# Altium footprint library MB1404.PcbLib: 69 footprints (part 2 of 5)
Each footprint in its own frame and in the unit in brackets; x right, y up, seen from the top. Pads: shape width x height; smd on the part's side, far side on the other; paste and mask are expansions set on the pad; w line width, h text height; cw(c..) or ccw(c..) is an arc to the next point about the centre after c.
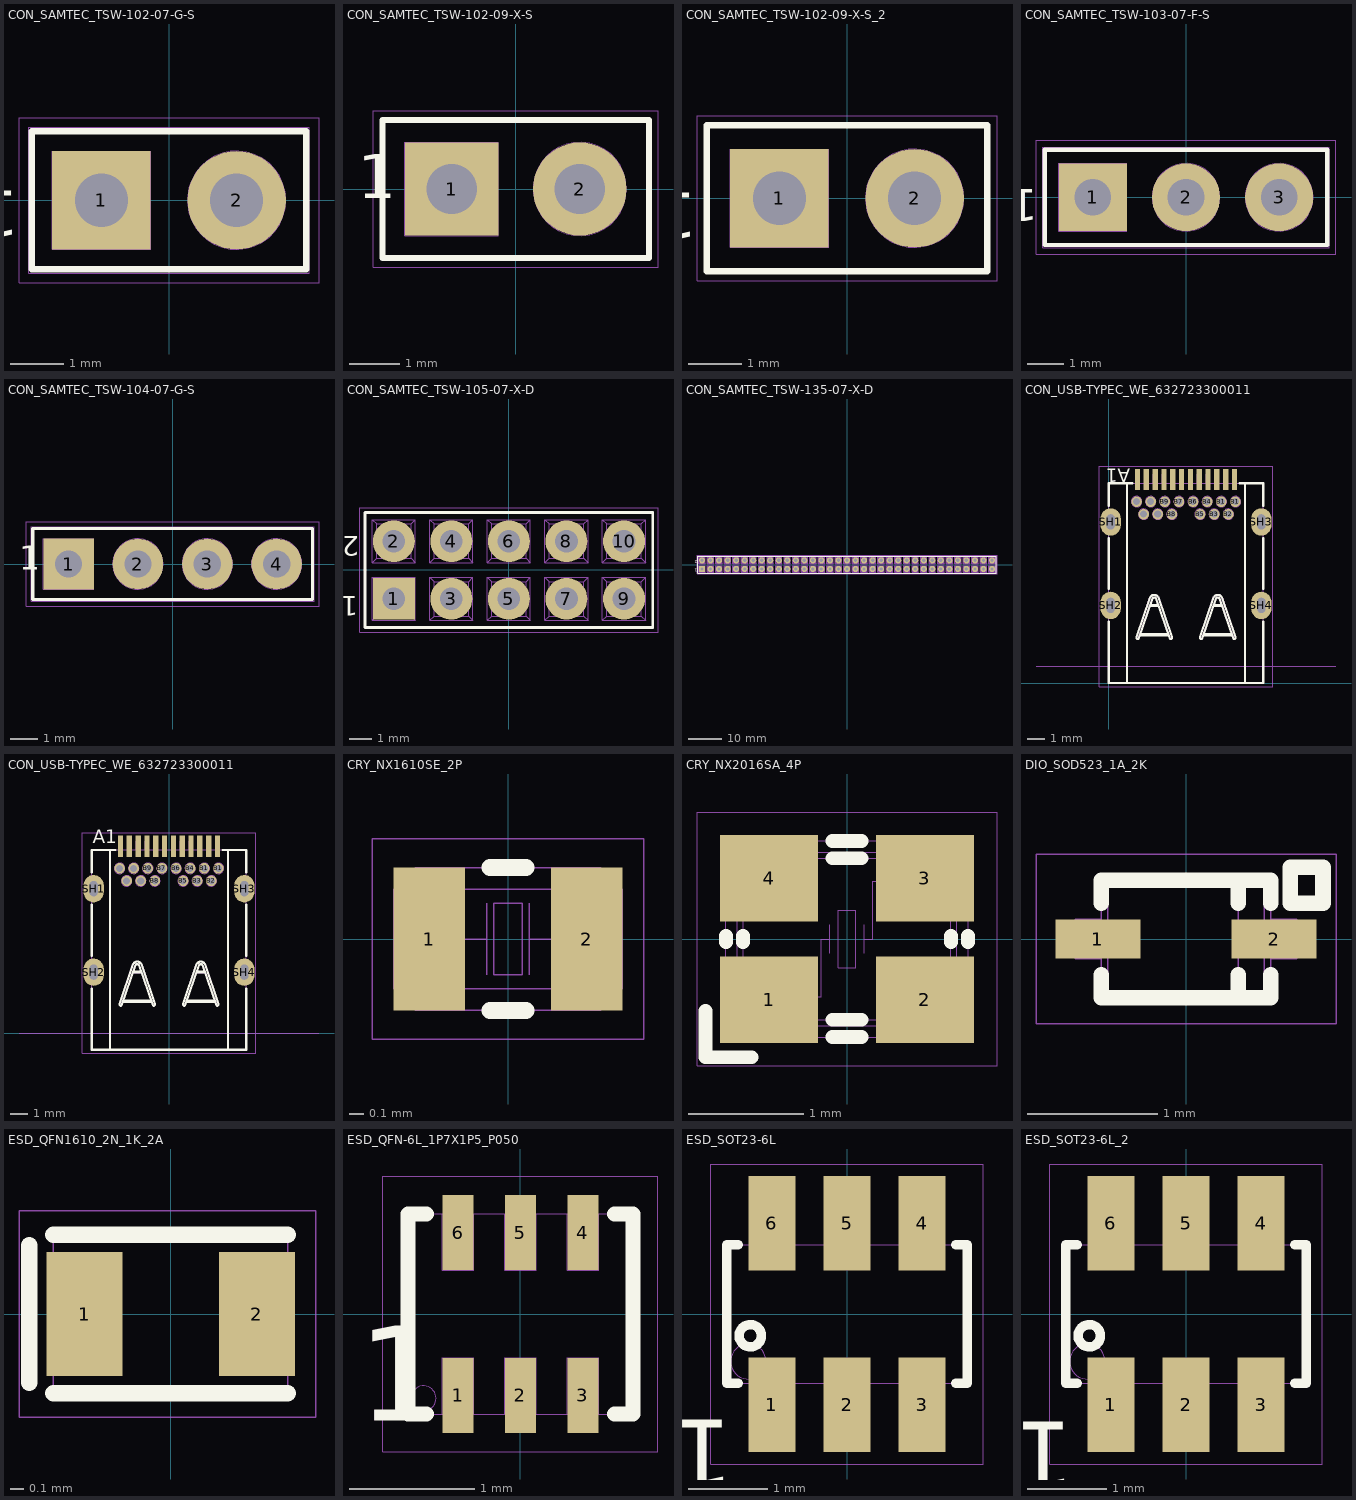
[diagram p1: the footprints below, top view; thin cyan lines are the x and y axes]

## CON_SAMTEC_TSW-102-07-G-S [mm]
height 8.38
pads (2):
  rect 1.85x1.85 / inner round 1.85 / far side rect 1.85x1.85 hole 1 mask+0.05: 1(-1.27,0)
  round 1.85 hole 1 mask+0.05: 2(1.27,0)
Top Overlay:
  lines w0.12: -2.58,-1.3 2.58,-1.3 2.58,1.3 -2.58,1.3 -2.58,-1.3
  text "1" at -2.819,0.474 h1.5
Mechanical 14:
  circle w0.01: c1.27,0 r0.925
  lines w0.01: -2.64,-1.37 2.64,-1.37 2.64,1.37 -2.64,1.37 -2.64,-1.37 ; -2.195,-0.925 -2.195,0.925 -0.345,0.925 -0.345,-0.925 -2.195,-0.925
  text "1" at -1.525,-0.525 h1.5
  text "'.Designator'" at 4.756,-0.251 h0.75
Mechanical 16:
  lines w0.01: -2.82,-1.55 2.82,-1.55 2.82,1.55 -2.82,1.55 -2.82,-1.55
3D body "TSW-102-07-G-S.stp": height 8.38, standoff -2.54, extent -2.667,-1.27 2.54,1.27
3D body: height 8.38, standoff 0, extent -2.579,-1.299 2.579,1.299

## CON_SAMTEC_TSW-102-09-X-S [mm]
height 8.38
pads (2):
  rect 1.85x1.85 / inner round 1.85 / far side rect 1.85x1.85 hole 1 mask+0.05: 1(-1.27,0)
  round 1.85 hole 1 mask+0.05: 2(1.27,0)
Top Overlay:
  lines w0.12: -2.64,-1.37 -2.64,1.37 2.64,1.37 2.64,-1.37 -2.64,-1.37
  text "1" at -3.125,-0.475 h1.5
Mechanical 14:
  circle w0.01: c1.27,0 r0.925
  lines w0.01: -2.64,-1.37 -2.64,1.37 2.64,1.37 2.64,-1.37 -2.64,-1.37 ; -2.195,-0.925 -0.345,-0.925 -0.345,0.925 -2.195,0.925 -2.195,-0.925
  text "'.Designator'" at -0.78,2.025 h0.75
  text "1" at -1.525,-0.525 h1.5
Mechanical 16:
  lines w0.01: -2.82,-1.55 -2.82,1.55 2.82,1.55 2.82,-1.55 -2.82,-1.55
3D body "TSW-102-09-G-S.stp": height 8.38, standoff -10.16, extent -2.667,-1.27 2.54,1.27
3D body: height 8.38, standoff 0, extent -2.579,-1.299 2.579,1.299

## CON_SAMTEC_TSW-102-09-X-S_2 [mm]
pads (2):
  rect 1.85x1.85 / inner round 1.85 / far side rect 1.85x1.85 hole 1 mask+0.05: 1(-1.27,0)
  round 1.85 hole 1 mask+0.05: 2(1.27,0)
Top Overlay:
  lines w0.12: -2.64,-1.37 2.64,-1.37 2.64,1.37 -2.64,1.37 -2.64,-1.37
  text "1" at -2.816,0.399 h1.5
Mechanical 14:
  circle w0.01: c1.27,0 r0.925
  lines w0.01: -2.64,-1.37 2.64,-1.37 2.64,1.37 -2.64,1.37 -2.64,-1.37 ; -2.195,-0.925 -2.195,0.925 -0.345,0.925 -0.345,-0.925 -2.195,-0.925
  text "1" at -1.525,-0.525 h1.5
  text "'.Designator'" at 4.509,-0.226 h0.75
Mechanical 16:
  lines w0.01: -2.82,-1.55 2.82,-1.55 2.82,1.55 -2.82,1.55 -2.82,-1.55
3D body: height 8.38, standoff 0, extent -2.579,-1.299 2.579,1.299
3D body "TSW-102-09-G-S.stp": height 8.38, standoff -10.16, extent -2.667,-1.27 2.54,1.27

## CON_SAMTEC_TSW-103-07-F-S [mm]
height 8.38
pads (3):
  rect 1.85x1.85 / inner round 1.85 / far side rect 1.85x1.85 hole 1 mask+0.05: 1(-2.54,0)
  round 1.85 hole 1 mask+0.05: 2(0,0) 3(2.54,0)
Top Overlay:
  lines w0.12: -3.85,-1.3 -3.85,1.3 3.85,1.3 3.85,-1.3 -3.85,-1.3
  text "1" at -4.044,0.504 h1.5
Mechanical 14:
  circle w0.01: c2.54,0 r0.925
  circle w0.01: c0,0 r0.925
  lines w0.01: -3.91,-1.37 -3.91,1.37 3.91,1.37 3.91,-1.37 -3.91,-1.37 ; -3.465,-0.925 -1.615,-0.925 -1.615,0.925 -3.465,0.925 -3.465,-0.925
  text "1" at -2.73,-0.5 h1.5
  text "'.Designator'" at 4.521,0.729 h0.75
Mechanical 16:
  lines w0.01: -4.09,-1.55 -4.09,1.55 4.09,1.55 4.09,-1.55 -4.09,-1.55
3D body: height 8.38, standoff 0, extent -3.915,-1.375 3.915,1.375
3D body "Samtec-TSW-103-07-F-S.STEP": height 8.38, standoff -2.54, extent -3.805,-1.27 3.815,1.27

## CON_SAMTEC_TSW-104-07-G-S [mm]
height 8.38
pads (4):
  rect 1.85x1.85 / inner round 1.85 / far side rect 1.85x1.85 hole 1 mask+0.05: 1(-3.81,0)
  round 1.85 hole 1 mask+0.05: 2(-1.27,0) 3(1.27,0) 4(3.81,0)
Top Overlay:
  lines w0.12: -5.12,-1.3 -5.12,1.3 5.12,1.3 5.12,-1.3 -5.12,-1.3
  text "1" at -5.625,-0.5 h1.5
Mechanical 14:
  circle w0.01: c3.81,0 r0.925
  circle w0.01: c1.27,0 r0.925
  circle w0.01: c-1.27,0 r0.925
  lines w0.01: -5.18,-1.37 -5.18,1.37 5.18,1.37 5.18,-1.37 -5.18,-1.37 ; -4.735,-0.925 -2.885,-0.925 -2.885,0.925 -4.735,0.925 -4.735,-0.925
  text "4" at 3.425,-0.45 h1.5
  text "1" at -4,-0.5 h1.5
  text "'.Designator'" at -4.626,-0.784 h0.75
Mechanical 16:
  lines w0.01: -5.36,-1.55 -5.36,1.55 5.36,1.55 5.36,-1.55 -5.36,-1.55
3D body: height 8.38, standoff 0, extent -5.185,-1.375 5.185,1.375
3D body "TSW-104-07-G-S.stp": height 8.38, standoff -2.54, extent -5.207,-1.27 5.08,1.27

## CON_SAMTEC_TSW-105-07-X-D [mm]
height 8.38
pads (10):
  rect 1.85x1.85 / inner round 1.85 / far side rect 1.85x1.85 hole 1 mask+0.05: 1(-5.08,-1.27)
  round 1.85 hole 1 mask+0.05: 2(-5.08,1.27) 3(-2.54,-1.27) 4(-2.54,1.27) 5(0,-1.27) 6(0,1.27) 7(2.54,-1.27) 8(2.54,1.27) 9(5.08,-1.27) 10(5.08,1.27)
Top Overlay:
  lines w0.12: -6.35,-2.54 6.35,-2.54 6.35,2.54 -6.35,2.54 -6.35,-2.54
  text "2" at -6.611,1.779 h1.5
  text "1" at -6.661,-0.871 h1.5
Mechanical 14:
  lines w0.01: -6.032,-2.222 -5.842,-2.032 ; -6.032,-2.222 -4.127,-2.222 ; -6.032,-2.222 -6.032,-0.318 ; -6.032,-0.318 -5.842,-0.508 ; -6.032,-0.318 -4.127,-0.318 ; -6.032,0.318 -6.032,2.222 ; -6.032,0.318 -4.127,0.318 ; -6.032,0.318 -5.842,0.508 ; -6.032,2.222 -4.127,2.222 ; -6.032,2.222 -5.842,2.032 ; -5.842,-2.032 -5.842,-0.508 ; -5.842,-2.032 -4.318,-2.032 ; -5.842,-0.508 -4.318,-0.508 ; -5.842,0.508 -4.318,0.508 ; -5.842,0.508 -5.842,2.032 ; -5.842,2.032 -4.318,2.032 ; -4.318,-2.032 -4.127,-2.222 ; -4.318,-2.032 -4.318,-0.508 ; -4.318,-0.508 -4.127,-0.318 ; -4.318,0.508 -4.318,2.032 ; -4.318,0.508 -4.127,0.318 ; -4.318,2.032 -4.127,2.222 ; -4.127,-2.222 -4.127,-0.318 ; -4.127,0.318 -4.127,2.222 ; -3.492,-2.222 -3.492,-0.318 ; -3.492,-2.222 -1.587,-2.222 ; -3.492,-2.222 -3.302,-2.032 ; -3.492,-0.318 -1.587,-0.318 ; -3.492,-0.318 -3.302,-0.508 ; -3.492,0.318 -3.492,2.222 ; -3.492,0.318 -1.587,0.318 ; -3.492,0.318 -3.302,0.508 ; -3.492,2.222 -1.587,2.222 ; -3.492,2.222 -3.302,2.032 ; -3.302,-2.032 -1.778,-2.032 ; -3.302,-2.032 -3.302,-0.508 ; -3.302,-0.508 -1.778,-0.508 ; -3.302,0.508 -1.778,0.508 ; -3.302,0.508 -3.302,2.032 ; -3.302,2.032 -1.778,2.032 ; -1.778,-2.032 -1.778,-0.508 ; -1.778,-2.032 -1.587,-2.222 ; -1.778,-0.508 -1.587,-0.318 ; -1.778,0.508 -1.778,2.032 ; -1.778,0.508 -1.587,0.318 ; -1.778,2.032 -1.587,2.222 ; -1.587,-2.222 -1.587,-0.318 ; -1.587,0.318 -1.587,2.222 ; -0.953,-2.222 -0.953,-0.318 ; -0.953,-2.222 0.953,-2.222 ; -0.953,-2.222 -0.762,-2.032 ; -0.953,-0.318 0.953,-0.318 ; -0.953,-0.318 -0.762,-0.508 ; -0.953,0.318 -0.953,2.222 ; -0.953,0.318 0.953,0.318 ; -0.953,0.318 -0.762,0.508 ; -0.953,2.222 0.953,2.222 ; -0.953,2.222 -0.762,2.032 ; -0.762,-2.032 0.762,-2.032 ; -0.762,-2.032 -0.762,-0.508 ; -0.762,-0.508 0.762,-0.508 ; -0.762,0.508 0.762,0.508 ; -0.762,0.508 -0.762,2.032 ; -0.762,2.032 0.762,2.032 ; 0.762,-2.032 0.762,-0.508 ; 0.762,-2.032 0.953,-2.222 ; 0.762,-0.508 0.953,-0.318 ; 0.762,0.508 0.762,2.032 ; 0.762,0.508 0.953,0.318 ; 0.762,2.032 0.953,2.222 ; 0.953,-2.222 0.953,-0.318 ; 0.953,0.318 0.953,2.222 ; 1.587,-2.222 1.587,-0.318 ; 1.587,-2.222 3.492,-2.222 ; 1.587,-2.222 1.778,-2.032 ; 1.587,-0.318 3.492,-0.318 ; 1.587,-0.318 1.778,-0.508 ; 1.587,0.318 1.587,2.222 ; 1.587,0.318 3.492,0.318 ; 1.587,0.318 1.778,0.508 ; 1.587,2.222 3.492,2.222 ; 1.587,2.222 1.778,2.032 ; 1.778,-2.032 3.302,-2.032 ; 1.778,-2.032 1.778,-0.508 ; 1.778,-0.508 3.302,-0.508 ; 1.778,0.508 3.302,0.508 ; 1.778,0.508 1.778,2.032 ; 1.778,2.032 3.302,2.032 ; 3.302,-2.032 3.302,-0.508 ; 3.302,-2.032 3.492,-2.222 ; 3.302,-0.508 3.492,-0.318 ; 3.302,0.508 3.302,2.032 ; 3.302,0.508 3.492,0.318 ; 3.302,2.032 3.492,2.222 ; 3.492,-2.222 3.492,-0.318 ; 3.492,0.318 3.492,2.222 ; 4.127,-2.222 4.127,-0.318 ; 4.127,-2.222 6.032,-2.222 ; 4.127,-2.222 4.318,-2.032 ; 4.127,-0.318 6.032,-0.318 ; 4.127,-0.318 4.318,-0.508 ; 4.127,0.318 4.127,2.222 ; 4.127,0.318 6.032,0.318 ; 4.127,0.318 4.318,0.508 ; 4.127,2.222 6.032,2.222 ; 4.127,2.222 4.318,2.032 ; 4.318,-2.032 5.842,-2.032 ; 4.318,-2.032 4.318,-0.508 ; 4.318,-0.508 5.842,-0.508 ; 4.318,0.508 5.842,0.508 ; 4.318,0.508 4.318,2.032 ; 4.318,2.032 5.842,2.032 ; 5.842,-2.032 5.842,-0.508 ; 5.842,-2.032 6.032,-2.222 ; 5.842,-0.508 6.032,-0.318 ; 5.842,0.508 5.842,2.032 ; 5.842,0.508 6.032,0.318 ; 5.842,2.032 6.032,2.222 ; 6.032,-2.222 6.032,-0.318 ; 6.032,0.318 6.032,2.222 ; -6.35,-2.54 6.35,-2.54 6.35,2.54 -6.35,2.54 -6.35,-2.54
  text "1" at -5.345,-1.725 h1.5
  text "2" at -5.445,0.775 h1.5
  text "10" at 4.43,0.8 h1.5
  text "9" at 4.82,-1.725 h1.5
  text "'.Designator'" at 2.114,0.529 h0.75
Mechanical 16:
  lines w0.01: -6.58,-2.75 -6.58,2.75 6.58,2.75 6.58,-2.75 -6.58,-2.75
3D body "TSW-105-07-G-D.stp": height 8.38, standoff -2.54, extent -6.35,-2.54 6.35,2.54
3D body: height 8.38, standoff 0, extent -6.35,-2.54 6.35,2.55

## CON_SAMTEC_TSW-135-07-X-D [mm]
height 8.38
pads (70):
  rect 1.85x1.85 / inner round 1.85 / far side rect 1.85x1.85 hole 1 mask+0.05: 1(-43.18,-1.27)
  round 1.85 hole 1 mask+0.05: 2(-43.18,1.27) 3(-40.64,-1.27) 4(-40.64,1.27) 5(-38.1,-1.27) 6(-38.1,1.27) 7(-35.56,-1.27) 8(-35.56,1.27) 9(-33.02,-1.27) 10(-33.02,1.27) 11(-30.48,-1.27) 12(-30.48,1.27) 13(-27.94,-1.27) 14(-27.94,1.27) 15(-25.4,-1.27) 16(-25.4,1.27) 17(-22.86,-1.27) 18(-22.86,1.27) 19(-20.32,-1.27) 20(-20.32,1.27) 21(-17.78,-1.27) 22(-17.78,1.27) 23(-15.24,-1.27) 24(-15.24,1.27) 25(-12.7,-1.27) 26(-12.7,1.27) 27(-10.16,-1.27) 28(-10.16,1.27) 29(-7.62,-1.27) 30(-7.62,1.27) 31(-5.08,-1.27) 32(-5.08,1.27) 33(-2.54,-1.27) 34(-2.54,1.27) 35(0,-1.27) 36(0,1.27) 37(2.54,-1.27) 38(2.54,1.27) 39(5.08,-1.27) 40(5.08,1.27) 41(7.62,-1.27) 42(7.62,1.27) 43(10.16,-1.27) 44(10.16,1.27) 45(12.7,-1.27) 46(12.7,1.27) 47(15.24,-1.27) 48(15.24,1.27) 49(17.78,-1.27) 50(17.78,1.27) 51(20.32,-1.27) 52(20.32,1.27) 53(22.86,-1.27) 54(22.86,1.27) 55(25.4,-1.27) 56(25.4,1.27) 57(27.94,-1.27) 58(27.94,1.27) 59(30.48,-1.27) 60(30.48,1.27) 61(33.02,-1.27) 62(33.02,1.27) 63(35.56,-1.27) 64(35.56,1.27) 65(38.1,-1.27) 66(38.1,1.27) 67(40.64,-1.27) 68(40.64,1.27) 69(43.18,-1.27) 70(43.18,1.27)
Top Overlay:
  lines w0.12: -44.45,-2.54 -44.45,2.54 44.45,2.54 44.45,-2.54 -44.45,-2.54
  text "2" at -44.631,1.649 h1.5
  text "1" at -44.606,-0.951 h1.5
Mechanical 14:
  drawing of 844 lines, arcs and shapes, not listed
  text "69" at 42.485,-1.725 h1.5
  text "70" at 42.51,0.825 h1.5
  text "2" at -43.495,0.85 h1.5
  text "1" at -43.395,-1.75 h1.5
  text "'.Designator'" at -0.681,0.874 h0.75
Mechanical 16:
  lines w0.01: -44.67,-2.75 44.67,-2.75 44.67,2.75 -44.67,2.75 -44.67,-2.75
3D body: height 8.38, standoff 0, extent -44.455,-2.545 44.45,2.545
3D body "TSW-135-07-G-D.stp": height 8.38, standoff -2.54, extent -44.45,-2.54 44.45,2.54

## CON_USB-TYPEC_WE_632723300011 [mm]
pads (30):
  rect 0.3x1.2 smd mask+0.05: A1(1.625,11.53) A2(2.125,11.53) A3(2.625,11.53) A4(3.125,11.53) A5(3.625,11.53) A6(4.125,11.53) A7(4.625,11.53) A8(5.125,11.53) A9(5.625,11.53) A10(6.125,11.53) A11(6.625,11.53) A12(7.125,11.53)
  round 0.6 hole 0.4 mask+0.05: B1(6.375,10.28) B1(7.175,10.28) B2(6.775,9.57) B3(5.975,9.57) B4(5.575,10.28) B5(5.175,9.57) B6(4.775,10.28) B7(3.975,10.28) B8(3.575,9.57) B9(3.175,10.28) B10(2.775,9.57) B11(1.975,9.57) B12(1.575,10.28) B12(2.375,10.28)
  oval 1.15x1.55 hole 0.45 slot 0.85 at 90 deg mask+0.05: SH1(0.105,9.13) SH2(0.105,4.4) SH3(8.645,9.13) SH4(8.645,4.4)
Top Overlay:
  lines w0.12: 0,3.475 0,0 8.75,0 8.75,3.475 ; 0,5.325 0,8.225 ; 0,10.05 0,11.325 1.35,11.325 ; 1.025,0 1.025,11.325 ; 1.75,2.7 3.4,2.7 ; 1.775,2.775 3.375,2.775 ; 2.325,4.375 2.825,4.375 ; 2.35,4.425 2.8,4.425 ; 5.35,2.7 7,2.7 ; 5.375,2.775 6.975,2.775 ; 5.925,4.375 6.425,4.375 ; 5.95,4.425 6.4,4.425 ; 7.4,11.325 8.75,11.325 8.75,10.05 ; 7.725,0 7.725,11.325 ; 8.75,5.325 8.75,8.225 ; 2.66,4.815 ccw(c2.575,4.729) 2.575,4.85 ccw(c2.575,4.729) 2.49,4.815 2.475,4.8 1.675,2.5 cw(c1.65,2.575) 1.575,2.6 2.325,4.85 2.404,4.929 cw(c2.575,4.759) 2.575,5 cw(c2.575,4.759) 2.746,4.929 2.825,4.85 3.575,2.6 cw(c3.5,2.575) 3.475,2.5 2.675,4.8 ; 2.66,4.815 2.675,4.8 ; 2.66,4.815 2.675,4.8 ; 6.075,4.8 6.09,4.815 ; 6.075,4.8 5.275,2.5 cw(c5.25,2.575) 5.175,2.6 5.925,4.85 6.004,4.929 cw(c6.175,4.759) 6.175,5 cw(c6.175,4.759) 6.346,4.929 6.425,4.85 7.175,2.6 cw(c7.1,2.575) 7.075,2.5 6.275,4.8 6.26,4.815 ccw(c6.175,4.729) 6.175,4.85 ccw(c6.175,4.729) 6.09,4.815 ; 6.075,4.8 6.09,4.815
  text "A1" at 1.225,12.395 h1.3
Mechanical 7:
  lines w0.01: -4.125,0.95 12.875,0.95
  text "EDGE" at 10.45,0.25 h1
  text "PCB" at -4.125,0.25 h1
Mechanical 14:
  circle w0.01: c7.175,10.28 r0.3
  circle w0.01: c6.775,9.57 r0.3
  circle w0.01: c6.375,10.28 r0.3
  circle w0.01: c5.975,9.57 r0.3
  circle w0.01: c5.575,10.28 r0.3
  circle w0.01: c5.175,9.57 r0.3
  circle w0.01: c4.775,10.28 r0.3
  circle w0.01: c3.975,10.28 r0.3
  circle w0.01: c3.575,9.57 r0.3
  circle w0.01: c3.175,10.28 r0.3
  circle w0.01: c2.775,9.57 r0.3
  circle w0.01: c2.375,10.28 r0.3
  circle w0.01: c1.975,9.57 r0.3
  circle w0.01: c1.575,10.28 r0.3
  lines w0.01: 1.025,0 1.025,11.33 ; 1.525,11.33 1.525,11.83 1.725,11.83 1.725,11.33 ; 1.75,2.7 3.4,2.7 ; 1.775,2.775 3.375,2.775 ; 2.025,11.33 2.025,11.83 2.225,11.83 2.225,11.33 ; 2.325,4.375 2.825,4.375 ; 2.35,4.425 2.8,4.425 ; 2.525,11.33 2.525,11.83 2.725,11.83 2.725,11.33 ; 3.025,11.33 3.025,11.83 3.225,11.83 3.225,11.33 ; 3.525,11.33 3.525,11.83 3.725,11.83 3.725,11.33 ; 4.025,11.33 4.025,11.83 4.225,11.83 4.225,11.33 ; 4.525,11.33 4.525,11.83 4.725,11.83 4.725,11.33 ; 5.025,11.33 5.025,11.83 5.225,11.83 5.225,11.33 ; 5.35,2.7 7,2.7 ; 5.375,2.775 6.975,2.775 ; 5.525,11.33 5.525,11.83 5.725,11.83 5.725,11.33 ; 5.925,4.375 6.425,4.375 ; 5.95,4.425 6.4,4.425 ; 6.025,11.33 6.025,11.83 6.225,11.83 6.225,11.33 ; 6.525,11.33 6.525,11.83 6.725,11.83 6.725,11.33 ; 7.025,11.33 7.025,11.83 7.225,11.83 7.225,11.33 ; 7.725,0 7.725,11.33 ; 2.66,4.815 ccw(c2.575,4.729) 2.575,4.85 ccw(c2.575,4.729) 2.49,4.815 2.475,4.8 1.675,2.5 cw(c1.65,2.575) 1.575,2.6 2.325,4.85 2.404,4.929 cw(c2.575,4.759) 2.575,5 cw(c2.575,4.759) 2.746,4.929 2.825,4.85 3.575,2.6 cw(c3.5,2.575) 3.475,2.5 2.675,4.8 ; 2.66,4.815 2.675,4.8 ; 2.66,4.815 2.675,4.8 ; 6.075,4.8 6.09,4.815 ; 6.075,4.8 5.275,2.5 cw(c5.25,2.575) 5.175,2.6 5.925,4.85 6.004,4.929 cw(c6.175,4.759) 6.175,5 cw(c6.175,4.759) 6.346,4.929 6.425,4.85 7.175,2.6 cw(c7.1,2.575) 7.075,2.5 6.275,4.8 6.26,4.815 ccw(c6.175,4.729) 6.175,4.85 ccw(c6.175,4.729) 6.09,4.815 ; 6.075,4.8 6.09,4.815 ; 0.005,0 0.005,11.33 8.745,11.33 8.745,0 0.005,0
  text "A12" at 6.75,11.4 h0.5
  text "A1" at 1.375,11.4 h0.5
  text "'.Designator'" at 6.25,7.645 h0.75
  text "B11" at 1.725,9.45 h0.4
  text "B9" at 2.875,10.15 h0.4
  text "B6" at 4.475,10.15 h0.4
  text "GND" at 6,10.15 h0.4
  text "B4" at 5.3,10.15 h0.4
  text "B10" at 2.475,9.425 h0.4
  text "B3" at 5.675,9.425 h0.4
  text "B8" at 3.3,9.45 h0.4
  text "B2" at 6.5,9.45 h0.4
  text "B7" at 3.7,10.15 h0.4
  text "B12" at 1.275,10.175 h0.4
  text "GND" at 2,10.15 h0.4
  text "B1" at 6.9,10.175 h0.4
  text "B5" at 4.9,9.425 h0.4
Mechanical 16:
  lines w0.01: -0.55,-0.2 9.3,-0.2 9.3,12.3 -0.55,12.3 -0.55,4.65 -0.55,-0.2
3D body "WURTH_ELEKTRONIK_USB_TYPE-C_632723300011_STP.stp": height 3.03, standoff -1.83, extent 0.005,-0.025 8.745,11.769
3D body: height 2.96, standoff 0, extent 0,0 8.75,11.325

## CON_USB-TYPEC_WE_632723300011  [mm] "MCD-02273"
height 2.96
pads (30):
  rect 0.3x1.2 smd mask+0.05: A1(-2.75,10.58) A2(-2.25,10.58) A3(-1.75,10.58) A4(-1.25,10.58) A5(-0.75,10.58) A6(-0.25,10.58) A7(0.25,10.58) A8(0.75,10.58) A9(1.25,10.58) A10(1.75,10.58) A11(2.25,10.58) A12(2.75,10.58)
  round 0.6 hole 0.4 mask+0.05: B1(2,9.33) B1(2.8,9.33) B2(2.4,8.62) B3(1.6,8.62) B4(1.2,9.33) B5(0.8,8.62) B6(0.4,9.33) B7(-0.4,9.33) B8(-0.8,8.62) B9(-1.2,9.33) B10(-1.6,8.62) B11(-2.4,8.62) B12(-2.8,9.33) B12(-2,9.33)
  oval 1.15x1.55 hole 0.45 slot 0.85 at 90 deg mask+0.05: SH1(-4.27,8.18) SH2(-4.27,3.45) SH3(4.27,8.18) SH4(4.27,3.45)
Top Overlay:
  lines w0.12: -4.375,2.525 -4.375,-0.95 4.375,-0.95 4.375,2.525 ; -4.375,4.375 -4.375,7.275 ; -4.375,9.1 -4.375,10.375 -3.025,10.375 ; -3.35,-0.95 -3.35,10.375 ; -2.625,1.75 -0.975,1.75 ; -2.6,1.825 -1,1.825 ; -2.05,3.425 -1.55,3.425 ; -2.025,3.475 -1.575,3.475 ; 0.975,1.75 2.625,1.75 ; 1,1.825 2.6,1.825 ; 1.55,3.425 2.05,3.425 ; 1.575,3.475 2.025,3.475 ; 3.025,10.375 4.375,10.375 4.375,9.1 ; 3.35,-0.95 3.35,10.375 ; 4.375,4.375 4.375,7.275 ; -1.715,3.865 ccw(c-1.8,3.779) -1.8,3.9 ccw(c-1.8,3.779) -1.885,3.865 -1.9,3.85 -2.7,1.55 cw(c-2.725,1.625) -2.8,1.65 -2.05,3.9 -1.971,3.979 cw(c-1.8,3.809) -1.8,4.05 cw(c-1.8,3.809) -1.629,3.979 -1.55,3.9 -0.8,1.65 cw(c-0.875,1.625) -0.9,1.55 -1.7,3.85 ; -1.715,3.865 -1.7,3.85 ; -1.715,3.865 -1.7,3.85 ; 1.7,3.85 1.715,3.865 ; 1.7,3.85 0.9,1.55 cw(c0.875,1.625) 0.8,1.65 1.55,3.9 1.629,3.979 cw(c1.8,3.809) 1.8,4.05 cw(c1.8,3.809) 1.971,3.979 2.05,3.9 2.8,1.65 cw(c2.725,1.625) 2.7,1.55 1.9,3.85 1.885,3.865 ccw(c1.8,3.779) 1.8,3.9 ccw(c1.8,3.779) 1.715,3.865 ; 1.7,3.85 1.715,3.865
  text "A1" at -4.325,10.505 h1.3
Mechanical 7:
  lines w0.01: -8.5,0 8.5,0
  text "EDGE" at 6.075,-0.7 h1
  text "PCB" at -8.5,-0.7 h1
Mechanical 14:
  circle w0.01: c2.8,9.33 r0.3
  circle w0.01: c2.4,8.62 r0.3
  circle w0.01: c2,9.33 r0.3
  circle w0.01: c1.6,8.62 r0.3
  circle w0.01: c1.2,9.33 r0.3
  circle w0.01: c0.8,8.62 r0.3
  circle w0.01: c0.4,9.33 r0.3
  circle w0.01: c-0.4,9.33 r0.3
  circle w0.01: c-0.8,8.62 r0.3
  circle w0.01: c-1.2,9.33 r0.3
  circle w0.01: c-1.6,8.62 r0.3
  circle w0.01: c-2,9.33 r0.3
  circle w0.01: c-2.4,8.62 r0.3
  circle w0.01: c-2.8,9.33 r0.3
  lines w0.01: -3.35,-0.95 -3.35,10.38 ; -2.85,10.38 -2.85,10.88 -2.65,10.88 -2.65,10.38 ; -2.625,1.75 -0.975,1.75 ; -2.6,1.825 -1,1.825 ; -2.35,10.38 -2.35,10.88 -2.15,10.88 -2.15,10.38 ; -2.05,3.425 -1.55,3.425 ; -2.025,3.475 -1.575,3.475 ; -1.85,10.38 -1.85,10.88 -1.65,10.88 -1.65,10.38 ; -1.35,10.38 -1.35,10.88 -1.15,10.88 -1.15,10.38 ; -0.85,10.38 -0.85,10.88 -0.65,10.88 -0.65,10.38 ; -0.35,10.38 -0.35,10.88 -0.15,10.88 -0.15,10.38 ; 0.15,10.38 0.15,10.88 0.35,10.88 0.35,10.38 ; 0.65,10.38 0.65,10.88 0.85,10.88 0.85,10.38 ; 0.975,1.75 2.625,1.75 ; 1,1.825 2.6,1.825 ; 1.15,10.38 1.15,10.88 1.35,10.88 1.35,10.38 ; 1.55,3.425 2.05,3.425 ; 1.575,3.475 2.025,3.475 ; 1.65,10.38 1.65,10.88 1.85,10.88 1.85,10.38 ; 2.15,10.38 2.15,10.88 2.35,10.88 2.35,10.38 ; 2.65,10.38 2.65,10.88 2.85,10.88 2.85,10.38 ; 3.35,-0.95 3.35,10.38 ; -1.715,3.865 ccw(c-1.8,3.779) -1.8,3.9 ccw(c-1.8,3.779) -1.885,3.865 -1.9,3.85 -2.7,1.55 cw(c-2.725,1.625) -2.8,1.65 -2.05,3.9 -1.971,3.979 cw(c-1.8,3.809) -1.8,4.05 cw(c-1.8,3.809) -1.629,3.979 -1.55,3.9 -0.8,1.65 cw(c-0.875,1.625) -0.9,1.55 -1.7,3.85 ; -1.715,3.865 -1.7,3.85 ; -1.715,3.865 -1.7,3.85 ; 1.7,3.85 1.715,3.865 ; 1.7,3.85 0.9,1.55 cw(c0.875,1.625) 0.8,1.65 1.55,3.9 1.629,3.979 cw(c1.8,3.809) 1.8,4.05 cw(c1.8,3.809) 1.971,3.979 2.05,3.9 2.8,1.65 cw(c2.725,1.625) 2.7,1.55 1.9,3.85 1.885,3.865 ccw(c1.8,3.779) 1.8,3.9 ccw(c1.8,3.779) 1.715,3.865 ; 1.7,3.85 1.715,3.865 ; -4.37,-0.95 -4.37,10.38 4.37,10.38 4.37,-0.95 -4.37,-0.95
  text "A12" at 2.375,10.45 h0.5
  text "A1" at -3,10.45 h0.5
  text "B4" at 0,0 h0.4
  text "GND" at 0,0 h0.4
  text "GND" at 0,0 h0.4
  text "B6" at 0,0 h0.4
  text "B9" at 0,0 h0.4
  text "B1" at 0,0 h0.4
  text "B3" at 0,0 h0.4
  text "B10" at 0,0 h0.4
  text "B2" at 0,0 h0.4
  text "B7" at 0,0 h0.4
  text "'.Designator'" at 0,0 h0.75
  text "B12" at 0,0 h0.4
  text "B11" at 0,0 h0.4
  text "B5" at 0,0 h0.4
  text "B8" at 0,0 h0.4
Mechanical 16:
  lines w0.01: -4.925,-1.15 4.925,-1.15 4.925,11.35 -4.925,11.35 -4.925,3.7 -4.925,-1.15
3D body "WURTH_ELEKTRONIK_USB_TYPE-C_632723300011_STP.stp": height 3.03, standoff -1.83, extent -4.37,-0.975 4.37,10.819
3D body: height 2.96, standoff 0, extent -4.375,-0.95 4.375,10.375

## CRY_NX1610SE_2P [mm] "MCD-02291"
height 0.45
pads (2):
  rect 0.5x1 smd mask+0.05: 1(-0.55,0) 2(0.55,0)
Top Overlay:
  lines w0.12: -0.125,-0.5 0.125,-0.5 ; -0.125,0.5 0.125,0.5
Mechanical 14:
  lines w0.01: -0.5,0 -0.15,0 ; -0.15,-0.25 -0.15,0.25 ; 0.15,-0.25 0.15,0.25 ; 0.15,0 0.5,0 ; -0.8,-0.35 cw(c-0.8,-0.5) -0.65,-0.5 0.65,-0.5 cw(c0.8,-0.5) 0.8,-0.35 0.8,0.35 cw(c0.8,0.5) 0.65,0.5 -0.65,0.5 cw(c-0.8,0.5) -0.8,0.35 -0.8,-0.35 ; -0.65,-0.2 ccw(c-0.5,-0.2) -0.5,-0.35 0.5,-0.35 ccw(c0.5,-0.2) 0.65,-0.2 0.65,0.2 ccw(c0.5,0.2) 0.5,0.35 -0.5,0.35 ccw(c-0.5,0.2) -0.65,0.2 -0.65,-0.2 ; -0.1,-0.25 -0.1,0.25 0.1,0.25 0.1,-0.25 -0.1,-0.25
  text "'.Designator'" at 0.625,0.5 h0.75
Mechanical 16:
  lines w0.01: -0.95,-0.7 -0.95,0.7 0.95,0.7 0.95,-0.7 -0.95,-0.7
3D body: height 0.25, standoff 0, extent -0.8,-0.5 0.8,0.5
3D body: height 0.35, standoff 0.25, extent -0.65,-0.35 0.65,0.35
3D body: height 0.45, standoff 0.35, extent -0.6,-0.3 0.6,0.3

## CRY_NX2016SA_4P [mm]
height 0.5
pads (4):
  rect 0.85x0.75 smd mask+0.05: 1(-0.675,-0.525) 2(0.675,-0.525) 3(0.675,0.525) 4(-0.675,0.525)
Top Overlay:
  lines w0.12: -1.225,-0.625 -1.225,-1.025 -0.825,-1.025 ; -1.05,-0.025 -1.05,0.025 ; -0.9,-0.025 -0.9,0.025 ; -0.125,-0.85 0.125,-0.85 ; -0.125,-0.7 0.125,-0.7 ; -0.125,0.7 0.125,0.7 ; -0.125,0.85 0.125,0.85 ; 0.9,-0.025 0.9,0.025 ; 1.05,-0.025 1.05,0.025
Mechanical 14:
  lines w0.01: -0.9,-0.25 -0.35,-0.25 -0.35,-0.7 ; -0.9,0.25 -0.35,0.25 -0.35,0.7 ; -0.325,-0.5 -0.225,-0.5 -0.225,0 -0.15,0 ; -0.15,-0.125 -0.15,0.125 ; 0.15,-0.125 0.15,0.125 ; 0.15,0 0.225,0 0.225,0.5 0.325,0.5 ; 0.35,-0.7 0.35,-0.25 0.9,-0.25 ; 0.35,0.7 0.35,0.25 0.9,0.25 ; -1.05,-0.7 cw(c-1.05,-0.85) -0.9,-0.85 0.9,-0.85 cw(c1.05,-0.85) 1.05,-0.7 1.05,0.7 cw(c1.05,0.85) 0.9,0.85 -0.9,0.85 cw(c-1.05,0.85) -1.05,0.7 -1.05,-0.7 ; -0.95,-0.6 ccw(c-0.8,-0.6) -0.8,-0.75 0.8,-0.75 ccw(c0.8,-0.6) 0.95,-0.6 0.95,0.6 ccw(c0.8,0.6) 0.8,0.75 -0.8,0.75 ccw(c-0.8,0.6) -0.95,0.6 -0.95,-0.6 ; -0.9,-0.6 ccw(c-0.8,-0.6) -0.8,-0.7 0.8,-0.7 ccw(c0.8,-0.6) 0.9,-0.6 0.9,0.6 ccw(c0.8,0.6) 0.8,0.7 -0.8,0.7 ccw(c-0.8,0.6) -0.9,0.6 -0.9,-0.6 ; -0.075,-0.25 -0.075,0.25 0.075,0.25 0.075,-0.25 -0.075,-0.25
  text "1" at -0.725,-0.65 h0.5
  text "2" at 0.525,-0.65 h0.5
  text "3" at 0.525,0.325 h0.5
  text "4" at -0.75,0.325 h0.5
  text "'.Designator'" at -2.229,4.466 h0.75
Mechanical 16:
  lines w0.01: -1.3,-1.1 1.3,-1.1 1.3,1.1 -1.3,1.1 -1.3,-1.1
3D body "NX2016.STEP": height 0.7, standoff 0, extent -1,-0.8 1,0.8
3D body: height 0.51, standoff 0.5, extent -0.9,-0.7 -0.575,-0.375
3D body: height 0.5, standoff 0, extent -1.05,-0.85 1.05,0.85

## DIO_SOD523_1A_2K [mm] "MCD-01677"
height 0.7
pads (2):
  rect 0.65x0.3 smd mask+0.05: 1(-0.675,0) 2(0.675,0)
Top Overlay:
  lines w0.12: -0.65,-0.275 -0.65,-0.45 0.65,-0.45 0.65,-0.275 ; -0.65,0.275 -0.65,0.45 0.65,0.45 0.65,0.275 ; 0.4,-0.45 0.4,-0.275 ; 0.4,0.275 0.4,0.45 ; 0.8,0.275 1.05,0.275 1.05,0.55 0.8,0.55 0.8,0.275
Mechanical 14:
  lines w0.01: -0.65,-0.15 -0.85,-0.15 -0.85,0.15 -0.65,0.15 ; 0.4,-0.4 0.4,0.4 ; 0.65,-0.15 0.85,-0.15 0.85,0.15 0.65,0.15 ; -0.65,-0.45 0.65,-0.45 ; -0.65,-0.45 -0.65,0.45 ; -0.65,-0.45 -0.6,-0.4 ; -0.65,0.45 0.65,0.45 ; -0.65,0.45 -0.6,0.4 ; -0.6,-0.4 -0.6,0.4 ; -0.6,-0.4 0.6,-0.4 ; -0.6,-0.4 -0.6,-0.4 ; -0.6,0.4 0.6,0.4 ; -0.6,0.4 -0.6,0.4 ; 0.6,-0.4 0.6,0.4 ; 0.6,-0.4 0.6,-0.4 ; 0.6,-0.4 0.65,-0.45 ; 0.6,0.4 0.65,0.45 ; 0.65,-0.45 0.65,0.45 ; 0.65,0.45 0.65,0.45
  text "K" at 0.675,0.175 h0.45
  text "'.Designator'" at 4.425,0.825 h0.75
Mechanical 16:
  lines w0.01: -1.15,-0.65 -1.15,0.65 1.15,0.65 1.15,-0.65 -1.15,-0.65
3D body: height 0.71, standoff 0.7, extent 0.4,-0.4 0.6,0.4
3D body: height 0.7, standoff 0.15, extent -0.65,-0.45 0.65,0.45
3D body: height 0.15, standoff 0, extent -0.65,-0.45 0.65,0.45
3D body: height 0.15, standoff 0, extent -0.85,-0.15 -0.4,0.15
3D body: height 0.15, standoff 0, extent 0.4,-0.15 0.85,0.15

## ESD_QFN1610_2N_1K_2A [mm] "DFN, 2-Leads, Body 1.60x1.00mm"
height 0.6
pads (2):
  rect 0.55x0.9 smd mask+0.05: 1(-0.625,0) 2(0.625,0)
Top Overlay:
  lines w0.12: -1.025,-0.5 -1.025,0.5 ; -0.85,-0.575 0.85,-0.575 ; -0.85,0.575 0.85,0.575
Mechanical 14:
  lines w0.01: -0.85,-0.55 -0.85,0.55 0.85,0.55 0.85,-0.55 -0.85,-0.55
  text "K" at -0.8,-0.325 h1
  text "'.Designator'" at 2.2,0.55 h0.75
Mechanical 16:
  lines w0.01: -1.1,-0.75 -1.1,0.75 1.05,0.75 1.05,-0.75 -1.1,-0.75
3D body: height 0.6, standoff 0, extent -0.85,-0.55 0.85,0.55
3D body: height 0.6, standoff 0, extent -0.85,-0.55 0.85,0.55

## ESD_QFN-6L_1P7X1P5_P050 [mm]
height 0.55
pads (6):
  rect 0.25x0.6 smd mask+0.05: 1(-0.5,-0.65) 2(0,-0.65) 3(0.5,-0.65) 4(0.5,0.65) 5(0,0.65) 6(-0.5,0.65)
Top Overlay:
  lines w0.12: -0.75,-0.8 -0.9,-0.8 -0.9,0.8 -0.75,0.8 ; 0.75,-0.8 0.9,-0.8 0.9,0.8 0.75,0.8
  text "1" at -1.3,-1.1 h1.3
Mechanical 14:
  circle w0.01: c-0.775,-0.675 r0.1
  lines w0.01: -0.625,-0.8 -0.625,-0.35 -0.375,-0.35 -0.375,-0.8 ; -0.625,0.8 -0.625,0.35 -0.375,0.35 -0.375,0.8 ; -0.125,-0.8 -0.125,-0.35 0.125,-0.35 0.125,-0.8 ; -0.125,0.8 -0.125,0.35 0.125,0.35 0.125,0.8 ; 0.375,-0.8 0.375,-0.35 0.625,-0.35 0.625,-0.8 ; 0.375,0.8 0.375,0.35 0.625,0.35 0.625,0.8 ; -0.9,-0.8 0.9,-0.8 0.9,0.8 -0.9,0.8 -0.9,-0.8
  text "6" at -0.6,0.425 h0.5
  text "5" at -0.1,0.425 h0.5
  text "4" at 0.39,0.433 h0.5
  text "3" at 0.4,-0.75 h0.5
  text "2" at -0.1,-0.75 h0.5
  text "1" at -0.575,-0.75 h0.5
  text "'.Designator'" at 1.95,0.525 h0.75
Mechanical 16:
  lines w0.01: -1.1,-1.1 -1.1,1.1 1.1,1.1 1.1,-1.1 -1.1,-1.1
3D body: height 0.55, standoff 0, extent -0.9,-0.8 0.9,0.8
3D body: height 0.56, standoff 0.55, extent -0.724,-0.625 -0.425,-0.325

## ESD_SOT23-6L [mm]
height 1.45
pads (6):
  rect 0.6x1.2 smd mask+0.05: 1(-0.95,-1.15) 2(0,-1.15) 3(0.95,-1.15) 4(0.95,1.15) 5(0,1.15) 6(-0.95,1.15)
Top Overlay:
  circle w0.12: c-1.225,-0.275 r0.141
  lines w0.12: -1.375,-0.875 -1.525,-0.875 -1.525,0.875 -1.375,0.875 ; 1.375,-0.875 1.525,-0.875 1.525,0.875 1.375,0.875
  text "1" at -1.434,-1.046 h1.5
Mechanical 14:
  circle w0.01: c-1.25,-0.6 r0.224
  lines w0.01: -1.2,-0.875 -1.2,-1.5 -0.7,-1.5 -0.7,-0.875 ; -1.2,0.875 -1.2,1.5 -0.7,1.5 -0.7,0.875 ; -0.25,-0.875 -0.25,-1.5 0.25,-1.5 0.25,-0.875 ; -0.25,0.875 -0.25,1.5 0.25,1.5 0.25,0.875 ; 0.7,-0.875 0.7,-1.5 1.2,-1.5 1.2,-0.875 ; 0.7,0.875 0.7,1.5 1.2,1.5 1.2,0.875 ; -1.525,-0.875 -1.525,0.875 1.525,0.875 1.525,-0.875 -1.525,-0.875
  text "2" at -0.15,-1.425 h0.75
  text "3" at 0.78,-1.43 h0.75
  text "1" at -1.05,-1.425 h0.75
  text "6" at -1.1,0.925 h0.75
  text "5" at -0.15,0.925 h0.75
  text "4" at 0.78,0.91 h0.75
  text "'.Designator'" at 4.691,0.829 h0.75
Mechanical 16:
  lines w0.01: -1.725,-1.9 -1.725,1.9 1.725,1.9 1.725,-1.9 -1.725,-1.9
3D body "SOT23-6.STEP": height 1.3, standoff 0, extent -1.5,-1.5 1.5,1.5
3D body: height 1.45, standoff 0, extent -1.524,-0.874 1.524,0.874

## ESD_SOT23-6L_2 [mm]
pads (6):
  rect 0.6x1.2 smd mask+0.05: 1(-0.95,-1.15) 2(0,-1.15) 3(0.95,-1.15) 4(0.95,1.15) 5(0,1.15) 6(-0.95,1.15)
Top Overlay:
  circle w0.12: c-1.225,-0.275 r0.141
  lines w0.12: -1.375,-0.875 -1.525,-0.875 -1.525,0.875 -1.375,0.875 ; 1.375,-0.875 1.525,-0.875 1.525,0.875 1.375,0.875
  text "1" at -1.409,-1.071 h1.5
Mechanical 14:
  circle w0.01: c-1.25,-0.6 r0.224
  lines w0.01: -1.2,-0.875 -1.2,-1.5 -0.7,-1.5 -0.7,-0.875 ; -1.2,0.875 -1.2,1.5 -0.7,1.5 -0.7,0.875 ; -0.25,-0.875 -0.25,-1.5 0.25,-1.5 0.25,-0.875 ; -0.25,0.875 -0.25,1.5 0.25,1.5 0.25,0.875 ; 0.7,-0.875 0.7,-1.5 1.2,-1.5 1.2,-0.875 ; 0.7,0.875 0.7,1.5 1.2,1.5 1.2,0.875 ; -1.525,-0.875 -1.525,0.875 1.525,0.875 1.525,-0.875 -1.525,-0.875
  text "2" at -0.15,-1.425 h0.75
  text "3" at 0.78,-1.43 h0.75
  text "1" at -1.05,-1.425 h0.75
  text "6" at -1.1,0.925 h0.75
  text "5" at -0.15,0.925 h0.75
  text "4" at 0.78,0.91 h0.75
  text "'.Designator'" at 4.425,0.725 h0.75
Mechanical 16:
  lines w0.01: -1.725,-1.9 -1.725,1.9 1.725,1.9 1.725,-1.9 -1.725,-1.9
3D body "SOT23-6.STEP": height 1.3, standoff 0, extent -1.5,-1.5 1.5,1.5
3D body: height 1.45, standoff 0, extent -1.524,-0.874 1.524,0.874